# Altium footprint library 2.54插件排母.PcbLib: 74 footprints (part 4 of 5)
Each footprint in its own frame and in the unit in brackets; x right, y up, seen from the top. Pads: shape width x height; smd on the part's side, far side on the other; paste and mask are expansions set on the pad; w line width, h text height; cw(c..) or ccw(c..) is an arc to the next point about the centre after c.
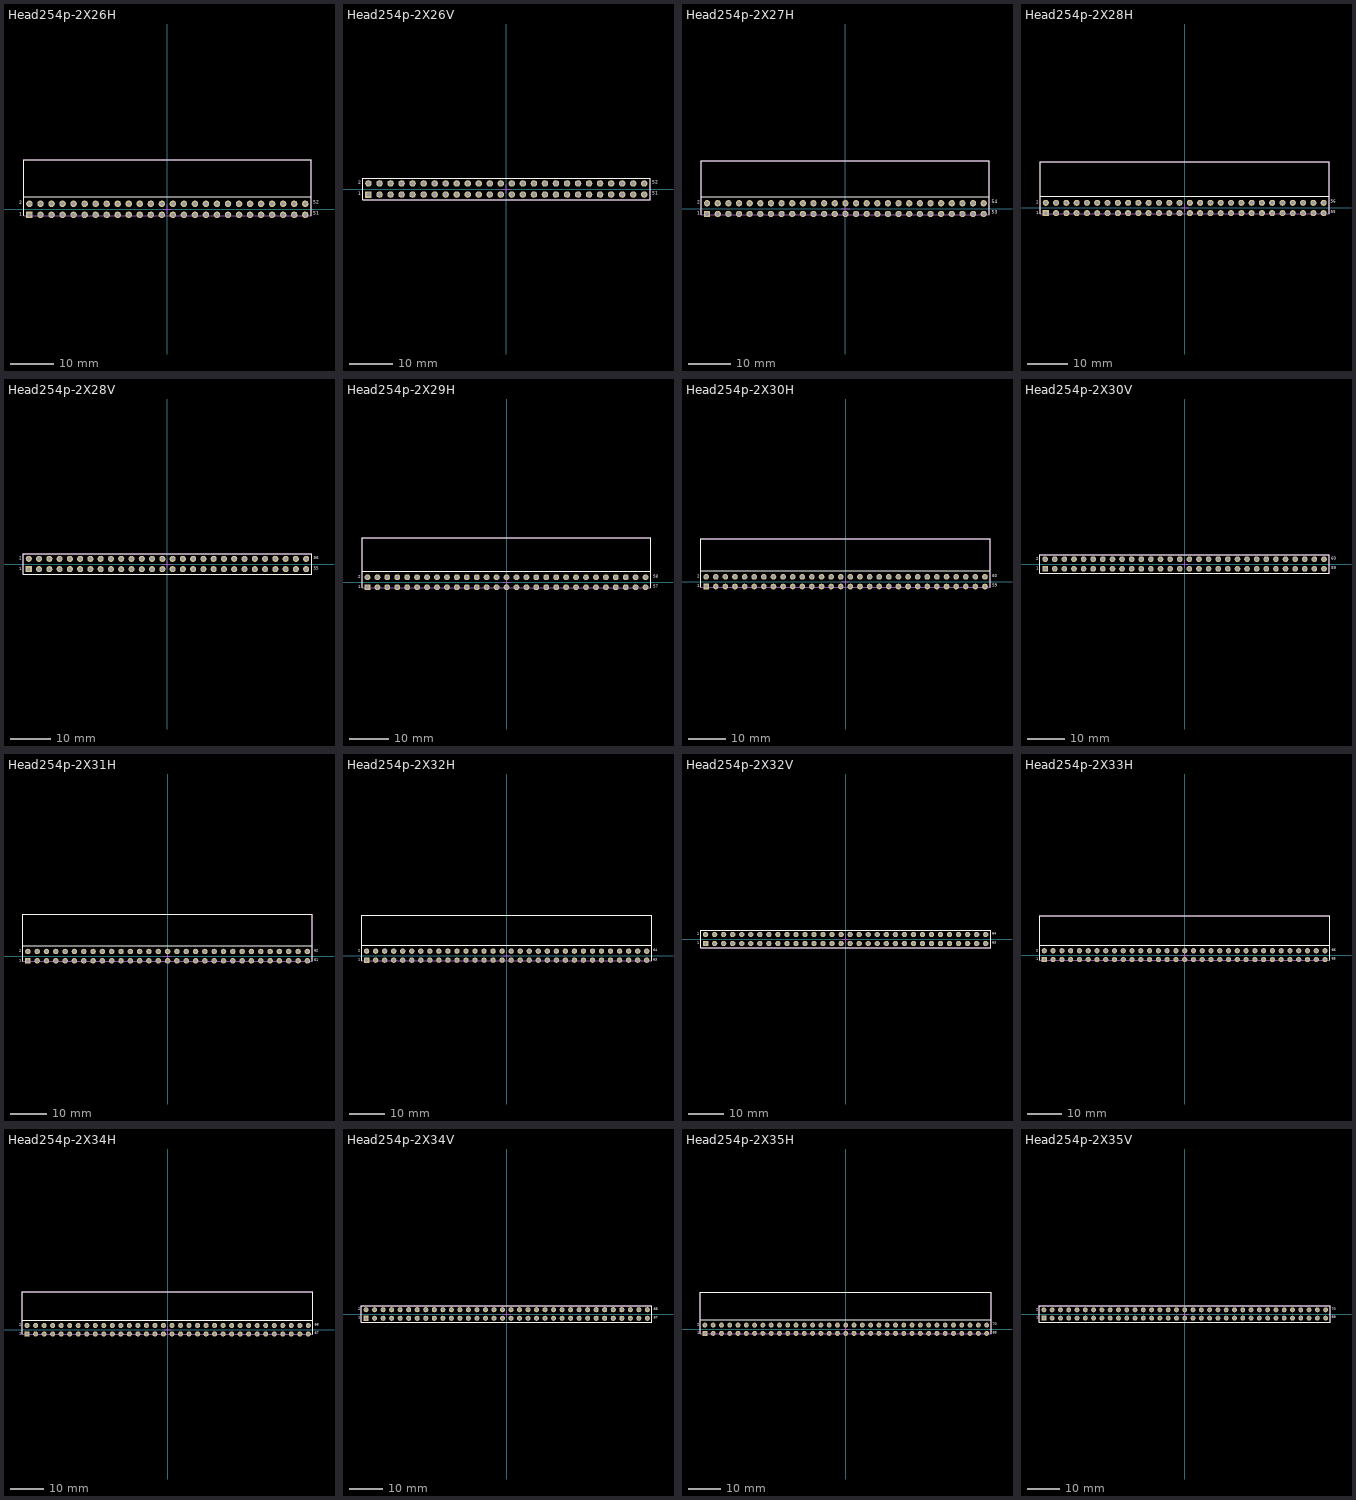
[diagram p3: the footprints below, top view; thin cyan lines are the x and y axes]

## Head254p-2X26H [mm] "2.54脚距 90度 插件 双排母"
height 5
pads (52):
  rect 1.5x1.5 hole 0.9: 1(-31.75,-1.27)
  round 1.5 hole 0.9: 2(-31.75,1.27) 3(-29.21,-1.27) 4(-29.21,1.27) 5(-26.67,-1.27) 6(-26.67,1.27) 7(-24.13,-1.27) 8(-24.13,1.27) 9(-21.59,-1.27) 10(-21.59,1.27) 11(-19.05,-1.27) 12(-19.05,1.27) 13(-16.51,-1.27) 14(-16.51,1.27) 15(-13.97,-1.27) 16(-13.97,1.27) 17(-11.43,-1.27) 18(-11.43,1.27) 19(-8.89,-1.27) 20(-8.89,1.27) 21(-6.35,-1.27) 22(-6.35,1.27) 23(-3.81,-1.27) 24(-3.81,1.27) 25(-1.27,-1.27) 26(-1.27,1.27) 27(1.27,-1.27) 28(1.27,1.27) 29(3.81,-1.27) 30(3.81,1.27) 31(6.35,-1.27) 32(6.35,1.27) 33(8.89,-1.27) 34(8.89,1.27) 35(11.43,-1.27) 36(11.43,1.27) 37(13.97,-1.27) 38(13.97,1.27) 39(16.51,-1.27) 40(16.51,1.27) 41(19.05,-1.27) 42(19.05,1.27) 43(21.59,-1.27) 44(21.59,1.27) 45(24.13,-1.27) 46(24.13,1.27) 47(26.67,-1.27) 48(26.67,1.27) 49(29.21,-1.27) 50(29.21,1.27) 51(31.75,-1.27) 52(31.75,1.27)
Top Overlay:
  lines w0.254: -33.12,-1.43 -33.12,11.37 33.12,11.37 33.12,-1.43 ; -33.12,2.87 33.12,2.87
  text "2" at -34.163,0.762 h1.27
  text "1" at -34.163,-1.778 h1.27
  text "51" at 33.655,-1.651 h1.27
  text "52" at 33.655,0.889 h1.27
Mechanical 13:
  lines w0.1: -33.12,-1.43 -33.12,11.37 33.12,11.37 33.12,-1.43 -33.12,-1.43
Mechanical 15:
  lines w0.1: -1,0 1,0 ; 0,-1 0,1
3D body: height 5.04, standoff -2.35, extent -33.12,-1.43 33.12,11.37

## Head254p-2X26V [mm] "2.54脚距 180度 插件 双排母"
height 9
pads (52):
  rect 1.5x1.5 hole 0.9: 1(-31.75,-1.27)
  round 1.5 hole 0.9: 2(-31.75,1.27) 3(-29.21,-1.27) 4(-29.21,1.27) 5(-26.67,-1.27) 6(-26.67,1.27) 7(-24.13,-1.27) 8(-24.13,1.27) 9(-21.59,-1.27) 10(-21.59,1.27) 11(-19.05,-1.27) 12(-19.05,1.27) 13(-16.51,-1.27) 14(-16.51,1.27) 15(-13.97,-1.27) 16(-13.97,1.27) 17(-11.43,-1.27) 18(-11.43,1.27) 19(-8.89,-1.27) 20(-8.89,1.27) 21(-6.35,-1.27) 22(-6.35,1.27) 23(-3.81,-1.27) 24(-3.81,1.27) 25(-1.27,-1.27) 26(-1.27,1.27) 27(1.27,-1.27) 28(1.27,1.27) 29(3.81,-1.27) 30(3.81,1.27) 31(6.35,-1.27) 32(6.35,1.27) 33(8.89,-1.27) 34(8.89,1.27) 35(11.43,-1.27) 36(11.43,1.27) 37(13.97,-1.27) 38(13.97,1.27) 39(16.51,-1.27) 40(16.51,1.27) 41(19.05,-1.27) 42(19.05,1.27) 43(21.59,-1.27) 44(21.59,1.27) 45(24.13,-1.27) 46(24.13,1.27) 47(26.67,-1.27) 48(26.67,1.27) 49(29.21,-1.27) 50(29.21,1.27) 51(31.75,-1.27) 52(31.75,1.27)
Top Overlay:
  lines w0.2: -33.12,-2.5 33.12,-2.5 33.12,2.5 -33.12,2.5 -33.12,-2.5
  text "2" at -34.163,0.762 h1.27
  text "1" at -34.163,-1.778 h1.27
  text "51" at 33.655,-1.651 h1.27
  text "52" at 33.655,0.889 h1.27
Mechanical 13:
  lines w0.1: -33.12,-2.5 -33.12,2.5 33.12,2.5 33.12,-2.5 -33.12,-2.5
Mechanical 15:
  lines w0.1: -1,0 1,0 ; 0,-1 0,1
3D body: height 8.5, standoff -3, extent -33.12,-2.5 33.12,2.5

## Head254p-2X27H [mm] "2.54脚距 90度 插件 双排母"
height 5
pads (54):
  rect 1.5x1.5 hole 0.9: 1(-33.02,-1.27)
  round 1.5 hole 0.9: 2(-33.02,1.27) 3(-30.48,-1.27) 4(-30.48,1.27) 5(-27.94,-1.27) 6(-27.94,1.27) 7(-25.4,-1.27) 8(-25.4,1.27) 9(-22.86,-1.27) 10(-22.86,1.27) 11(-20.32,-1.27) 12(-20.32,1.27) 13(-17.78,-1.27) 14(-17.78,1.27) 15(-15.24,-1.27) 16(-15.24,1.27) 17(-12.7,-1.27) 18(-12.7,1.27) 19(-10.16,-1.27) 20(-10.16,1.27) 21(-7.62,-1.27) 22(-7.62,1.27) 23(-5.08,-1.27) 24(-5.08,1.27) 25(-2.54,-1.27) 26(-2.54,1.27) 27(0,-1.27) 28(0,1.27) 29(2.54,-1.27) 30(2.54,1.27) 31(5.08,-1.27) 32(5.08,1.27) 33(7.62,-1.27) 34(7.62,1.27) 35(10.16,-1.27) 36(10.16,1.27) 37(12.7,-1.27) 38(12.7,1.27) 39(15.24,-1.27) 40(15.24,1.27) 41(17.78,-1.27) 42(17.78,1.27) 43(20.32,-1.27) 44(20.32,1.27) 45(22.86,-1.27) 46(22.86,1.27) 47(25.4,-1.27) 48(25.4,1.27) 49(27.94,-1.27) 50(27.94,1.27) 51(30.48,-1.27) 52(30.48,1.27) 53(33.02,-1.27) 54(33.02,1.27)
Top Overlay:
  lines w0.254: -34.39,-1.43 -34.39,11.37 34.39,11.37 34.39,-1.43 ; -34.39,2.87 34.39,2.87
  text "54" at 34.925,0.889 h1.27
  text "53" at 34.925,-1.651 h1.27
  text "1" at -35.433,-1.778 h1.27
  text "2" at -35.433,0.762 h1.27
Mechanical 13:
  lines w0.1: -34.39,-1.43 34.39,-1.43 34.39,11.37 -34.39,11.37 -34.39,-1.43
Mechanical 15:
  lines w0.1: -1,0 1,0 ; 0,-1 0,1
3D body: height 5.04, standoff -2.35, extent -34.39,-1.43 34.39,11.37

## Head254p-2X28H [mm] "2.54脚距 90度 插件 双排母"
height 5
pads (56):
  rect 1.5x1.5 hole 0.9: 1(-34.29,-1.27)
  round 1.5 hole 0.9: 2(-34.29,1.27) 3(-31.75,-1.27) 4(-31.75,1.27) 5(-29.21,-1.27) 6(-29.21,1.27) 7(-26.67,-1.27) 8(-26.67,1.27) 9(-24.13,-1.27) 10(-24.13,1.27) 11(-21.59,-1.27) 12(-21.59,1.27) 13(-19.05,-1.27) 14(-19.05,1.27) 15(-16.51,-1.27) 16(-16.51,1.27) 17(-13.97,-1.27) 18(-13.97,1.27) 19(-11.43,-1.27) 20(-11.43,1.27) 21(-8.89,-1.27) 22(-8.89,1.27) 23(-6.35,-1.27) 24(-6.35,1.27) 25(-3.81,-1.27) 26(-3.81,1.27) 27(-1.27,-1.27) 28(-1.27,1.27) 29(1.27,-1.27) 30(1.27,1.27) 31(3.81,-1.27) 32(3.81,1.27) 33(6.35,-1.27) 34(6.35,1.27) 35(8.89,-1.27) 36(8.89,1.27) 37(11.43,-1.27) 38(11.43,1.27) 39(13.97,-1.27) 40(13.97,1.27) 41(16.51,-1.27) 42(16.51,1.27) 43(19.05,-1.27) 44(19.05,1.27) 45(21.59,-1.27) 46(21.59,1.27) 47(24.13,-1.27) 48(24.13,1.27) 49(26.67,-1.27) 50(26.67,1.27) 51(29.21,-1.27) 52(29.21,1.27) 53(31.75,-1.27) 54(31.75,1.27) 55(34.29,-1.27) 56(34.29,1.27)
Top Overlay:
  lines w0.254: -35.66,-1.43 -35.66,11.37 35.66,11.37 35.66,-1.43 ; -35.66,2.87 35.66,2.87
  text "56" at 36.068,1.016 h1.27
  text "55" at 36.068,-1.524 h1.27
  text "1" at -36.703,-1.778 h1.27
  text "2" at -36.703,0.762 h1.27
Mechanical 13:
  lines w0.1: -35.66,-1.43 35.66,-1.43 35.66,11.37 -35.66,11.37 -35.66,-1.43
Mechanical 15:
  lines w0.1: -1,0 1,0 ; 0,-1 0,1
3D body: height 5.04, standoff -2.35, extent -35.66,-1.43 35.66,11.37

## Head254p-2X28V [mm] "2.54脚距 180度 插件 双排母"
height 9
pads (56):
  rect 1.5x1.5 hole 0.9: 1(-34.29,-1.27)
  round 1.5 hole 0.9: 2(-34.29,1.27) 3(-31.75,-1.27) 4(-31.75,1.27) 5(-29.21,-1.27) 6(-29.21,1.27) 7(-26.67,-1.27) 8(-26.67,1.27) 9(-24.13,-1.27) 10(-24.13,1.27) 11(-21.59,-1.27) 12(-21.59,1.27) 13(-19.05,-1.27) 14(-19.05,1.27) 15(-16.51,-1.27) 16(-16.51,1.27) 17(-13.97,-1.27) 18(-13.97,1.27) 19(-11.43,-1.27) 20(-11.43,1.27) 21(-8.89,-1.27) 22(-8.89,1.27) 23(-6.35,-1.27) 24(-6.35,1.27) 25(-3.81,-1.27) 26(-3.81,1.27) 27(-1.27,-1.27) 28(-1.27,1.27) 29(1.27,-1.27) 30(1.27,1.27) 31(3.81,-1.27) 32(3.81,1.27) 33(6.35,-1.27) 34(6.35,1.27) 35(8.89,-1.27) 36(8.89,1.27) 37(11.43,-1.27) 38(11.43,1.27) 39(13.97,-1.27) 40(13.97,1.27) 41(16.51,-1.27) 42(16.51,1.27) 43(19.05,-1.27) 44(19.05,1.27) 45(21.59,-1.27) 46(21.59,1.27) 47(24.13,-1.27) 48(24.13,1.27) 49(26.67,-1.27) 50(26.67,1.27) 51(29.21,-1.27) 52(29.21,1.27) 53(31.75,-1.27) 54(31.75,1.27) 55(34.29,-1.27) 56(34.29,1.27)
Top Overlay:
  lines w0.2: -35.66,-2.5 -35.66,2.5 35.66,2.5 35.66,-2.5 -35.66,-2.5
  text "56" at 36.195,0.889 h1.27
  text "55" at 36.195,-1.651 h1.27
  text "1" at -36.703,-1.778 h1.27
  text "2" at -36.703,0.762 h1.27
Mechanical 13:
  lines w0.1: -35.66,-2.5 35.66,-2.5 35.66,2.5 -35.66,2.5 -35.66,-2.5
Mechanical 15:
  lines w0.1: -1,0 1,0 ; 0,-1 0,1
3D body: height 8.5, standoff -3, extent -35.66,-2.5 35.66,2.5

## Head254p-2X29H [mm] "2.54脚距 90度 插件 双排母"
height 5
pads (58):
  rect 1.5x1.5 hole 0.9: 1(-35.56,-1.27)
  round 1.5 hole 0.9: 2(-35.56,1.27) 3(-33.02,-1.27) 4(-33.02,1.27) 5(-30.48,-1.27) 6(-30.48,1.27) 7(-27.94,-1.27) 8(-27.94,1.27) 9(-25.4,-1.27) 10(-25.4,1.27) 11(-22.86,-1.27) 12(-22.86,1.27) 13(-20.32,-1.27) 14(-20.32,1.27) 15(-17.78,-1.27) 16(-17.78,1.27) 17(-15.24,-1.27) 18(-15.24,1.27) 19(-12.7,-1.27) 20(-12.7,1.27) 21(-10.16,-1.27) 22(-10.16,1.27) 23(-7.62,-1.27) 24(-7.62,1.27) 25(-5.08,-1.27) 26(-5.08,1.27) 27(-2.54,-1.27) 28(-2.54,1.27) 29(0,-1.27) 30(0,1.27) 31(2.54,-1.27) 32(2.54,1.27) 33(5.08,-1.27) 34(5.08,1.27) 35(7.62,-1.27) 36(7.62,1.27) 37(10.16,-1.27) 38(10.16,1.27) 39(12.7,-1.27) 40(12.7,1.27) 41(15.24,-1.27) 42(15.24,1.27) 43(17.78,-1.27) 44(17.78,1.27) 45(20.32,-1.27) 46(20.32,1.27) 47(22.86,-1.27) 48(22.86,1.27) 49(25.4,-1.27) 50(25.4,1.27) 51(27.94,-1.27) 52(27.94,1.27) 53(30.48,-1.27) 54(30.48,1.27) 55(33.02,-1.27) 56(33.02,1.27) 57(35.56,-1.27) 58(35.56,1.27)
Top Overlay:
  lines w0.254: -36.93,-1.43 -36.93,11.37 36.93,11.37 36.93,-1.43 ; -36.93,2.87 36.93,2.87
  text "58" at 37.465,0.889 h1.27
  text "57" at 37.465,-1.651 h1.27
  text "1" at -37.973,-1.778 h1.27
  text "2" at -37.973,0.762 h1.27
Mechanical 13:
  lines w0.1: -36.93,-1.43 36.93,-1.43 36.93,11.37 -36.93,11.37 -36.93,-1.43
Mechanical 15:
  lines w0.1: -1,0 1,0 ; 0,-1 0,1
3D body: height 5.04, standoff -2.35, extent -36.93,-1.43 36.93,11.37

## Head254p-2X30H [mm] "2.54脚距 90度 插件 双排母"
height 5
pads (60):
  rect 1.5x1.5 hole 0.9: 1(-36.83,-1.27)
  round 1.5 hole 0.9: 2(-36.83,1.27) 3(-34.29,-1.27) 4(-34.29,1.27) 5(-31.75,-1.27) 6(-31.75,1.27) 7(-29.21,-1.27) 8(-29.21,1.27) 9(-26.67,-1.27) 10(-26.67,1.27) 11(-24.13,-1.27) 12(-24.13,1.27) 13(-21.59,-1.27) 14(-21.59,1.27) 15(-19.05,-1.27) 16(-19.05,1.27) 17(-16.51,-1.27) 18(-16.51,1.27) 19(-13.97,-1.27) 20(-13.97,1.27) 21(-11.43,-1.27) 22(-11.43,1.27) 23(-8.89,-1.27) 24(-8.89,1.27) 25(-6.35,-1.27) 26(-6.35,1.27) 27(-3.81,-1.27) 28(-3.81,1.27) 29(-1.27,-1.27) 30(-1.27,1.27) 31(1.27,-1.27) 32(1.27,1.27) 33(3.81,-1.27) 34(3.81,1.27) 35(6.35,-1.27) 36(6.35,1.27) 37(8.89,-1.27) 38(8.89,1.27) 39(11.43,-1.27) 40(11.43,1.27) 41(13.97,-1.27) 42(13.97,1.27) 43(16.51,-1.27) 44(16.51,1.27) 45(19.05,-1.27) 46(19.05,1.27) 47(21.59,-1.27) 48(21.59,1.27) 49(24.13,-1.27) 50(24.13,1.27) 51(26.67,-1.27) 52(26.67,1.27) 53(29.21,-1.27) 54(29.21,1.27) 55(31.75,-1.27) 56(31.75,1.27) 57(34.29,-1.27) 58(34.29,1.27) 59(36.83,-1.27) 60(36.83,1.27)
Top Overlay:
  lines w0.254: -38.2,-1.43 -38.2,11.37 38.2,11.37 38.2,-1.43 ; -38.2,2.87 38.2,2.87
  text "2" at -39.243,0.762 h1.27
  text "1" at -39.243,-1.778 h1.27
  text "59" at 38.735,-1.651 h1.27
  text "60" at 38.735,0.889 h1.27
Mechanical 13:
  lines w0.1: -38.2,-1.43 -38.2,11.37 38.2,11.37 38.2,-1.43 -38.2,-1.43
Mechanical 15:
  lines w0.1: -1,0 1,0 ; 0,-1 0,1
3D body: height 5.04, standoff -2.35, extent -38.2,-1.43 38.2,11.37

## Head254p-2X30V [mm] "2.54脚距 180度 插件 双排母"
height 9
pads (60):
  rect 1.5x1.5 hole 0.9: 1(-36.83,-1.27)
  round 1.5 hole 0.9: 2(-36.83,1.27) 3(-34.29,-1.27) 4(-34.29,1.27) 5(-31.75,-1.27) 6(-31.75,1.27) 7(-29.21,-1.27) 8(-29.21,1.27) 9(-26.67,-1.27) 10(-26.67,1.27) 11(-24.13,-1.27) 12(-24.13,1.27) 13(-21.59,-1.27) 14(-21.59,1.27) 15(-19.05,-1.27) 16(-19.05,1.27) 17(-16.51,-1.27) 18(-16.51,1.27) 19(-13.97,-1.27) 20(-13.97,1.27) 21(-11.43,-1.27) 22(-11.43,1.27) 23(-8.89,-1.27) 24(-8.89,1.27) 25(-6.35,-1.27) 26(-6.35,1.27) 27(-3.81,-1.27) 28(-3.81,1.27) 29(-1.27,-1.27) 30(-1.27,1.27) 31(1.27,-1.27) 32(1.27,1.27) 33(3.81,-1.27) 34(3.81,1.27) 35(6.35,-1.27) 36(6.35,1.27) 37(8.89,-1.27) 38(8.89,1.27) 39(11.43,-1.27) 40(11.43,1.27) 41(13.97,-1.27) 42(13.97,1.27) 43(16.51,-1.27) 44(16.51,1.27) 45(19.05,-1.27) 46(19.05,1.27) 47(21.59,-1.27) 48(21.59,1.27) 49(24.13,-1.27) 50(24.13,1.27) 51(26.67,-1.27) 52(26.67,1.27) 53(29.21,-1.27) 54(29.21,1.27) 55(31.75,-1.27) 56(31.75,1.27) 57(34.29,-1.27) 58(34.29,1.27) 59(36.83,-1.27) 60(36.83,1.27)
Top Overlay:
  lines w0.2: -38.2,-2.5 -38.2,2.5 38.2,2.5 38.2,-2.5 -38.2,-2.5
  text "60" at 38.735,0.889 h1.27
  text "59" at 38.735,-1.651 h1.27
  text "1" at -39.243,-1.778 h1.27
  text "2" at -39.243,0.762 h1.27
Mechanical 13:
  lines w0.1: -38.2,-2.5 38.2,-2.5 38.2,2.5 -38.2,2.5 -38.2,-2.5
Mechanical 15:
  lines w0.1: -1,0 1,0 ; 0,-1 0,1
3D body: height 8.5, standoff -3, extent -38.2,-2.5 38.2,2.5

## Head254p-2X31H [mm] "2.54脚距 90度 插件 双排母"
height 5
pads (62):
  rect 1.5x1.5 hole 0.9: 1(-38.1,-1.27)
  round 1.5 hole 0.9: 2(-38.1,1.27) 3(-35.56,-1.27) 4(-35.56,1.27) 5(-33.02,-1.27) 6(-33.02,1.27) 7(-30.48,-1.27) 8(-30.48,1.27) 9(-27.94,-1.27) 10(-27.94,1.27) 11(-25.4,-1.27) 12(-25.4,1.27) 13(-22.86,-1.27) 14(-22.86,1.27) 15(-20.32,-1.27) 16(-20.32,1.27) 17(-17.78,-1.27) 18(-17.78,1.27) 19(-15.24,-1.27) 20(-15.24,1.27) 21(-12.7,-1.27) 22(-12.7,1.27) 23(-10.16,-1.27) 24(-10.16,1.27) 25(-7.62,-1.27) 26(-7.62,1.27) 27(-5.08,-1.27) 28(-5.08,1.27) 29(-2.54,-1.27) 30(-2.54,1.27) 31(0,-1.27) 32(0,1.27) 33(2.54,-1.27) 34(2.54,1.27) 35(5.08,-1.27) 36(5.08,1.27) 37(7.62,-1.27) 38(7.62,1.27) 39(10.16,-1.27) 40(10.16,1.27) 41(12.7,-1.27) 42(12.7,1.27) 43(15.24,-1.27) 44(15.24,1.27) 45(17.78,-1.27) 46(17.78,1.27) 47(20.32,-1.27) 48(20.32,1.27) 49(22.86,-1.27) 50(22.86,1.27) 51(25.4,-1.27) 52(25.4,1.27) 53(27.94,-1.27) 54(27.94,1.27) 55(30.48,-1.27) 56(30.48,1.27) 57(33.02,-1.27) 58(33.02,1.27) 59(35.56,-1.27) 60(35.56,1.27) 61(38.1,-1.27) 62(38.1,1.27)
Top Overlay:
  lines w0.254: -39.47,-1.43 -39.47,11.37 39.47,11.37 39.47,-1.43 ; -39.47,2.87 39.47,2.87
  text "62" at 40.005,0.889 h1.27
  text "61" at 40.005,-1.651 h1.27
  text "1" at -40.513,-1.778 h1.27
  text "2" at -40.513,0.762 h1.27
Mechanical 13:
  lines w0.1: -39.47,-1.43 39.47,-1.43 39.47,11.37 -39.47,11.37 -39.47,-1.43
Mechanical 15:
  lines w0.1: -1,0 1,0 ; 0,-1 0,1
3D body: height 5.04, standoff -2.35, extent -39.47,-1.43 39.47,11.37

## Head254p-2X32H [mm] "2.54脚距 90度 插件 双排母"
height 5
pads (64):
  rect 1.5x1.5 hole 0.9: 1(-39.37,-1.27)
  round 1.5 hole 0.9: 2(-39.37,1.27) 3(-36.83,-1.27) 4(-36.83,1.27) 5(-34.29,-1.27) 6(-34.29,1.27) 7(-31.75,-1.27) 8(-31.75,1.27) 9(-29.21,-1.27) 10(-29.21,1.27) 11(-26.67,-1.27) 12(-26.67,1.27) 13(-24.13,-1.27) 14(-24.13,1.27) 15(-21.59,-1.27) 16(-21.59,1.27) 17(-19.05,-1.27) 18(-19.05,1.27) 19(-16.51,-1.27) 20(-16.51,1.27) 21(-13.97,-1.27) 22(-13.97,1.27) 23(-11.43,-1.27) 24(-11.43,1.27) 25(-8.89,-1.27) 26(-8.89,1.27) 27(-6.35,-1.27) 28(-6.35,1.27) 29(-3.81,-1.27) 30(-3.81,1.27) 31(-1.27,-1.27) 32(-1.27,1.27) 33(1.27,-1.27) 34(1.27,1.27) 35(3.81,-1.27) 36(3.81,1.27) 37(6.35,-1.27) 38(6.35,1.27) 39(8.89,-1.27) 40(8.89,1.27) 41(11.43,-1.27) 42(11.43,1.27) 43(13.97,-1.27) 44(13.97,1.27) 45(16.51,-1.27) 46(16.51,1.27) 47(19.05,-1.27) 48(19.05,1.27) 49(21.59,-1.27) 50(21.59,1.27) 51(24.13,-1.27) 52(24.13,1.27) 53(26.67,-1.27) 54(26.67,1.27) 55(29.21,-1.27) 56(29.21,1.27) 57(31.75,-1.27) 58(31.75,1.27) 59(34.29,-1.27) 60(34.29,1.27) 61(36.83,-1.27) 62(36.83,1.27) 63(39.37,-1.27) 64(39.37,1.27)
Top Overlay:
  lines w0.254: -40.74,-1.43 -40.74,11.37 40.74,11.37 40.74,-1.43 ; -40.74,2.87 40.74,2.87
  text "2" at -41.783,0.762 h1.27
  text "1" at -41.783,-1.778 h1.27
  text "63" at 41.275,-1.651 h1.27
  text "64" at 41.275,0.889 h1.27
Mechanical 13:
  lines w0.1: -40.74,-1.43 -40.74,11.37 40.74,11.37 40.74,-1.43 -40.74,-1.43
Mechanical 15:
  lines w0.1: -1,0 1,0 ; 0,-1 0,1
3D body: height 5.04, standoff -2.35, extent -40.74,-1.43 40.74,11.37

## Head254p-2X32V [mm] "2.54脚距 180度 插件 双排母"
height 9
pads (64):
  rect 1.5x1.5 hole 0.9: 1(-39.37,-1.27)
  round 1.5 hole 0.9: 2(-39.37,1.27) 3(-36.83,-1.27) 4(-36.83,1.27) 5(-34.29,-1.27) 6(-34.29,1.27) 7(-31.75,-1.27) 8(-31.75,1.27) 9(-29.21,-1.27) 10(-29.21,1.27) 11(-26.67,-1.27) 12(-26.67,1.27) 13(-24.13,-1.27) 14(-24.13,1.27) 15(-21.59,-1.27) 16(-21.59,1.27) 17(-19.05,-1.27) 18(-19.05,1.27) 19(-16.51,-1.27) 20(-16.51,1.27) 21(-13.97,-1.27) 22(-13.97,1.27) 23(-11.43,-1.27) 24(-11.43,1.27) 25(-8.89,-1.27) 26(-8.89,1.27) 27(-6.35,-1.27) 28(-6.35,1.27) 29(-3.81,-1.27) 30(-3.81,1.27) 31(-1.27,-1.27) 32(-1.27,1.27) 33(1.27,-1.27) 34(1.27,1.27) 35(3.81,-1.27) 36(3.81,1.27) 37(6.35,-1.27) 38(6.35,1.27) 39(8.89,-1.27) 40(8.89,1.27) 41(11.43,-1.27) 42(11.43,1.27) 43(13.97,-1.27) 44(13.97,1.27) 45(16.51,-1.27) 46(16.51,1.27) 47(19.05,-1.27) 48(19.05,1.27) 49(21.59,-1.27) 50(21.59,1.27) 51(24.13,-1.27) 52(24.13,1.27) 53(26.67,-1.27) 54(26.67,1.27) 55(29.21,-1.27) 56(29.21,1.27) 57(31.75,-1.27) 58(31.75,1.27) 59(34.29,-1.27) 60(34.29,1.27) 61(36.83,-1.27) 62(36.83,1.27) 63(39.37,-1.27) 64(39.37,1.27)
Top Overlay:
  lines w0.2: -40.74,-2.5 40.74,-2.5 40.74,2.5 -40.74,2.5 -40.74,-2.5
  text "2" at -41.783,0.762 h1.27
  text "1" at -41.783,-1.778 h1.27
  text "63" at 41.275,-1.651 h1.27
  text "64" at 41.275,0.889 h1.27
Mechanical 13:
  lines w0.1: -40.74,-2.5 -40.74,2.5 40.74,2.5 40.74,-2.5 -40.74,-2.5
Mechanical 15:
  lines w0.1: -1,0 1,0 ; 0,-1 0,1
3D body: height 8.5, standoff -3, extent -40.74,-2.5 40.74,2.5

## Head254p-2X33H [mm] "2.54脚距 90度 插件 双排母"
height 5
pads (66):
  rect 1.5x1.5 hole 0.9: 1(-40.64,-1.27)
  round 1.5 hole 0.9: 2(-40.64,1.27) 3(-38.1,-1.27) 4(-38.1,1.27) 5(-35.56,-1.27) 6(-35.56,1.27) 7(-33.02,-1.27) 8(-33.02,1.27) 9(-30.48,-1.27) 10(-30.48,1.27) 11(-27.94,-1.27) 12(-27.94,1.27) 13(-25.4,-1.27) 14(-25.4,1.27) 15(-22.86,-1.27) 16(-22.86,1.27) 17(-20.32,-1.27) 18(-20.32,1.27) 19(-17.78,-1.27) 20(-17.78,1.27) 21(-15.24,-1.27) 22(-15.24,1.27) 23(-12.7,-1.27) 24(-12.7,1.27) 25(-10.16,-1.27) 26(-10.16,1.27) 27(-7.62,-1.27) 28(-7.62,1.27) 29(-5.08,-1.27) 30(-5.08,1.27) 31(-2.54,-1.27) 32(-2.54,1.27) 33(0,-1.27) 34(0,1.27) 35(2.54,-1.27) 36(2.54,1.27) 37(5.08,-1.27) 38(5.08,1.27) 39(7.62,-1.27) 40(7.62,1.27) 41(10.16,-1.27) 42(10.16,1.27) 43(12.7,-1.27) 44(12.7,1.27) 45(15.24,-1.27) 46(15.24,1.27) 47(17.78,-1.27) 48(17.78,1.27) 49(20.32,-1.27) 50(20.32,1.27) 51(22.86,-1.27) 52(22.86,1.27) 53(25.4,-1.27) 54(25.4,1.27) 55(27.94,-1.27) 56(27.94,1.27) 57(30.48,-1.27) 58(30.48,1.27) 59(33.02,-1.27) 60(33.02,1.27) 61(35.56,-1.27) 62(35.56,1.27) 63(38.1,-1.27) 64(38.1,1.27) 65(40.64,-1.27) 66(40.64,1.27)
Top Overlay:
  lines w0.254: -42.01,-1.43 -42.01,11.37 42.01,11.37 42.01,-1.43 ; -42.01,2.87 42.01,2.87
  text "66" at 42.545,0.889 h1.27
  text "65" at 42.545,-1.651 h1.27
  text "1" at -43.053,-1.778 h1.27
  text "2" at -43.053,0.762 h1.27
Mechanical 13:
  lines w0.1: -42.01,-1.43 42.01,-1.43 42.01,11.37 -42.01,11.37 -42.01,-1.43
Mechanical 15:
  lines w0.1: -1,0 1,0 ; 0,-1 0,1
3D body: height 5.04, standoff -2.35, extent -42.01,-1.43 42.01,11.37

## Head254p-2X34H [mm] "2.54脚距 90度 插件 双排母"
height 5
pads (68):
  rect 1.5x1.5 hole 0.9: 1(-41.91,-1.27)
  round 1.5 hole 0.9: 2(-41.91,1.27) 3(-39.37,-1.27) 4(-39.37,1.27) 5(-36.83,-1.27) 6(-36.83,1.27) 7(-34.29,-1.27) 8(-34.29,1.27) 9(-31.75,-1.27) 10(-31.75,1.27) 11(-29.21,-1.27) 12(-29.21,1.27) 13(-26.67,-1.27) 14(-26.67,1.27) 15(-24.13,-1.27) 16(-24.13,1.27) 17(-21.59,-1.27) 18(-21.59,1.27) 19(-19.05,-1.27) 20(-19.05,1.27) 21(-16.51,-1.27) 22(-16.51,1.27) 23(-13.97,-1.27) 24(-13.97,1.27) 25(-11.43,-1.27) 26(-11.43,1.27) 27(-8.89,-1.27) 28(-8.89,1.27) 29(-6.35,-1.27) 30(-6.35,1.27) 31(-3.81,-1.27) 32(-3.81,1.27) 33(-1.27,-1.27) 34(-1.27,1.27) 35(1.27,-1.27) 36(1.27,1.27) 37(3.81,-1.27) 38(3.81,1.27) 39(6.35,-1.27) 40(6.35,1.27) 41(8.89,-1.27) 42(8.89,1.27) 43(11.43,-1.27) 44(11.43,1.27) 45(13.97,-1.27) 46(13.97,1.27) 47(16.51,-1.27) 48(16.51,1.27) 49(19.05,-1.27) 50(19.05,1.27) 51(21.59,-1.27) 52(21.59,1.27) 53(24.13,-1.27) 54(24.13,1.27) 55(26.67,-1.27) 56(26.67,1.27) 57(29.21,-1.27) 58(29.21,1.27) 59(31.75,-1.27) 60(31.75,1.27) 61(34.29,-1.27) 62(34.29,1.27) 63(36.83,-1.27) 64(36.83,1.27) 65(39.37,-1.27) 66(39.37,1.27) 67(41.91,-1.27) 68(41.91,1.27)
Top Overlay:
  lines w0.254: -43.28,-1.43 -43.28,11.37 43.28,11.37 43.28,-1.43 ; -43.28,2.87 43.28,2.87
  text "2" at -44.323,0.762 h1.27
  text "1" at -44.323,-1.778 h1.27
  text "67" at 43.815,-1.651 h1.27
  text "68" at 43.815,0.889 h1.27
Mechanical 13:
  lines w0.1: -43.28,-1.43 -43.28,11.37 43.28,11.37 43.28,-1.43 -43.28,-1.43
Mechanical 15:
  lines w0.1: -1,0 1,0 ; 0,-1 0,1
3D body: height 5.04, standoff -2.35, extent -43.28,-1.43 43.28,11.37

## Head254p-2X34V [mm] "2.54脚距 180度 插件 双排母"
height 9
pads (68):
  rect 1.5x1.5 hole 0.9: 1(-41.91,-1.27)
  round 1.5 hole 0.9: 2(-41.91,1.27) 3(-39.37,-1.27) 4(-39.37,1.27) 5(-36.83,-1.27) 6(-36.83,1.27) 7(-34.29,-1.27) 8(-34.29,1.27) 9(-31.75,-1.27) 10(-31.75,1.27) 11(-29.21,-1.27) 12(-29.21,1.27) 13(-26.67,-1.27) 14(-26.67,1.27) 15(-24.13,-1.27) 16(-24.13,1.27) 17(-21.59,-1.27) 18(-21.59,1.27) 19(-19.05,-1.27) 20(-19.05,1.27) 21(-16.51,-1.27) 22(-16.51,1.27) 23(-13.97,-1.27) 24(-13.97,1.27) 25(-11.43,-1.27) 26(-11.43,1.27) 27(-8.89,-1.27) 28(-8.89,1.27) 29(-6.35,-1.27) 30(-6.35,1.27) 31(-3.81,-1.27) 32(-3.81,1.27) 33(-1.27,-1.27) 34(-1.27,1.27) 35(1.27,-1.27) 36(1.27,1.27) 37(3.81,-1.27) 38(3.81,1.27) 39(6.35,-1.27) 40(6.35,1.27) 41(8.89,-1.27) 42(8.89,1.27) 43(11.43,-1.27) 44(11.43,1.27) 45(13.97,-1.27) 46(13.97,1.27) 47(16.51,-1.27) 48(16.51,1.27) 49(19.05,-1.27) 50(19.05,1.27) 51(21.59,-1.27) 52(21.59,1.27) 53(24.13,-1.27) 54(24.13,1.27) 55(26.67,-1.27) 56(26.67,1.27) 57(29.21,-1.27) 58(29.21,1.27) 59(31.75,-1.27) 60(31.75,1.27) 61(34.29,-1.27) 62(34.29,1.27) 63(36.83,-1.27) 64(36.83,1.27) 65(39.37,-1.27) 66(39.37,1.27) 67(41.91,-1.27) 68(41.91,1.27)
Top Overlay:
  lines w0.2: -43.28,-2.5 -43.28,2.5 43.28,2.5 43.28,-2.5 -43.28,-2.5
  text "68" at 43.815,0.889 h1.27
  text "67" at 43.815,-1.651 h1.27
  text "1" at -44.323,-1.778 h1.27
  text "2" at -44.323,0.762 h1.27
Mechanical 13:
  lines w0.1: -43.28,-2.5 43.28,-2.5 43.28,2.5 -43.28,2.5 -43.28,-2.5
Mechanical 15:
  lines w0.1: -1,0 1,0 ; 0,-1 0,1
3D body: height 8.5, standoff -3, extent -43.28,-2.5 43.28,2.5

## Head254p-2X35H [mm] "2.54脚距 90度 插件 双排母"
height 5
pads (70):
  rect 1.5x1.5 hole 0.9: 1(-43.18,-1.27)
  round 1.5 hole 0.9: 2(-43.18,1.27) 3(-40.64,-1.27) 4(-40.64,1.27) 5(-38.1,-1.27) 6(-38.1,1.27) 7(-35.56,-1.27) 8(-35.56,1.27) 9(-33.02,-1.27) 10(-33.02,1.27) 11(-30.48,-1.27) 12(-30.48,1.27) 13(-27.94,-1.27) 14(-27.94,1.27) 15(-25.4,-1.27) 16(-25.4,1.27) 17(-22.86,-1.27) 18(-22.86,1.27) 19(-20.32,-1.27) 20(-20.32,1.27) 21(-17.78,-1.27) 22(-17.78,1.27) 23(-15.24,-1.27) 24(-15.24,1.27) 25(-12.7,-1.27) 26(-12.7,1.27) 27(-10.16,-1.27) 28(-10.16,1.27) 29(-7.62,-1.27) 30(-7.62,1.27) 31(-5.08,-1.27) 32(-5.08,1.27) 33(-2.54,-1.27) 34(-2.54,1.27) 35(0,-1.27) 36(0,1.27) 37(2.54,-1.27) 38(2.54,1.27) 39(5.08,-1.27) 40(5.08,1.27) 41(7.62,-1.27) 42(7.62,1.27) 43(10.16,-1.27) 44(10.16,1.27) 45(12.7,-1.27) 46(12.7,1.27) 47(15.24,-1.27) 48(15.24,1.27) 49(17.78,-1.27) 50(17.78,1.27) 51(20.32,-1.27) 52(20.32,1.27) 53(22.86,-1.27) 54(22.86,1.27) 55(25.4,-1.27) 56(25.4,1.27) 57(27.94,-1.27) 58(27.94,1.27) 59(30.48,-1.27) 60(30.48,1.27) 61(33.02,-1.27) 62(33.02,1.27) 63(35.56,-1.27) 64(35.56,1.27) 65(38.1,-1.27) 66(38.1,1.27) 67(40.64,-1.27) 68(40.64,1.27) 69(43.18,-1.27) 70(43.18,1.27)
Top Overlay:
  lines w0.254: -44.55,-1.43 -44.55,11.37 44.55,11.37 44.55,-1.43 ; -44.55,2.87 44.55,2.87
  text "2" at -45.593,0.762 h1.27
  text "1" at -45.593,-1.778 h1.27
  text "69" at 45.085,-1.651 h1.27
  text "70" at 45.085,0.889 h1.27
Mechanical 13:
  lines w0.1: -44.55,-1.43 -44.55,11.37 44.55,11.37 44.55,-1.43 -44.55,-1.43
Mechanical 15:
  lines w0.1: -1,0 1,0 ; 0,-1 0,1
3D body: height 5.04, standoff -2.35, extent -44.55,-1.43 44.55,11.37

## Head254p-2X35V [mm] "2.54脚距 180度 插件 双排母"
height 9
pads (70):
  rect 1.5x1.5 hole 0.9: 1(-43.18,-1.27)
  round 1.5 hole 0.9: 2(-43.18,1.27) 3(-40.64,-1.27) 4(-40.64,1.27) 5(-38.1,-1.27) 6(-38.1,1.27) 7(-35.56,-1.27) 8(-35.56,1.27) 9(-33.02,-1.27) 10(-33.02,1.27) 11(-30.48,-1.27) 12(-30.48,1.27) 13(-27.94,-1.27) 14(-27.94,1.27) 15(-25.4,-1.27) 16(-25.4,1.27) 17(-22.86,-1.27) 18(-22.86,1.27) 19(-20.32,-1.27) 20(-20.32,1.27) 21(-17.78,-1.27) 22(-17.78,1.27) 23(-15.24,-1.27) 24(-15.24,1.27) 25(-12.7,-1.27) 26(-12.7,1.27) 27(-10.16,-1.27) 28(-10.16,1.27) 29(-7.62,-1.27) 30(-7.62,1.27) 31(-5.08,-1.27) 32(-5.08,1.27) 33(-2.54,-1.27) 34(-2.54,1.27) 35(0,-1.27) 36(0,1.27) 37(2.54,-1.27) 38(2.54,1.27) 39(5.08,-1.27) 40(5.08,1.27) 41(7.62,-1.27) 42(7.62,1.27) 43(10.16,-1.27) 44(10.16,1.27) 45(12.7,-1.27) 46(12.7,1.27) 47(15.24,-1.27) 48(15.24,1.27) 49(17.78,-1.27) 50(17.78,1.27) 51(20.32,-1.27) 52(20.32,1.27) 53(22.86,-1.27) 54(22.86,1.27) 55(25.4,-1.27) 56(25.4,1.27) 57(27.94,-1.27) 58(27.94,1.27) 59(30.48,-1.27) 60(30.48,1.27) 61(33.02,-1.27) 62(33.02,1.27) 63(35.56,-1.27) 64(35.56,1.27) 65(38.1,-1.27) 66(38.1,1.27) 67(40.64,-1.27) 68(40.64,1.27) 69(43.18,-1.27) 70(43.18,1.27)
Top Overlay:
  lines w0.2: -44.55,-2.5 -44.55,2.5 44.55,2.5 44.55,-2.5 -44.55,-2.5
  text "70" at 45.085,0.889 h1.27
  text "69" at 45.085,-1.651 h1.27
  text "1" at -45.593,-1.778 h1.27
  text "2" at -45.593,0.762 h1.27
Mechanical 13:
  lines w0.1: -44.55,-2.5 44.55,-2.5 44.55,2.5 -44.55,2.5 -44.55,-2.5
Mechanical 15:
  lines w0.1: -1,0 1,0 ; 0,-1 0,1
3D body: height 8.5, standoff -3, extent -44.55,-2.5 44.55,2.5